# Altium footprint library SMDLibrary.PcbLib: 309 footprints (part 10 of 20)
Each footprint in its own frame and in the unit in brackets; x right, y up, seen from the top. Pads: shape width x height; smd on the part's side, far side on the other; paste and mask are expansions set on the pad; w line width, h text height; cw(c..) or ccw(c..) is an arc to the next point about the centre after c.
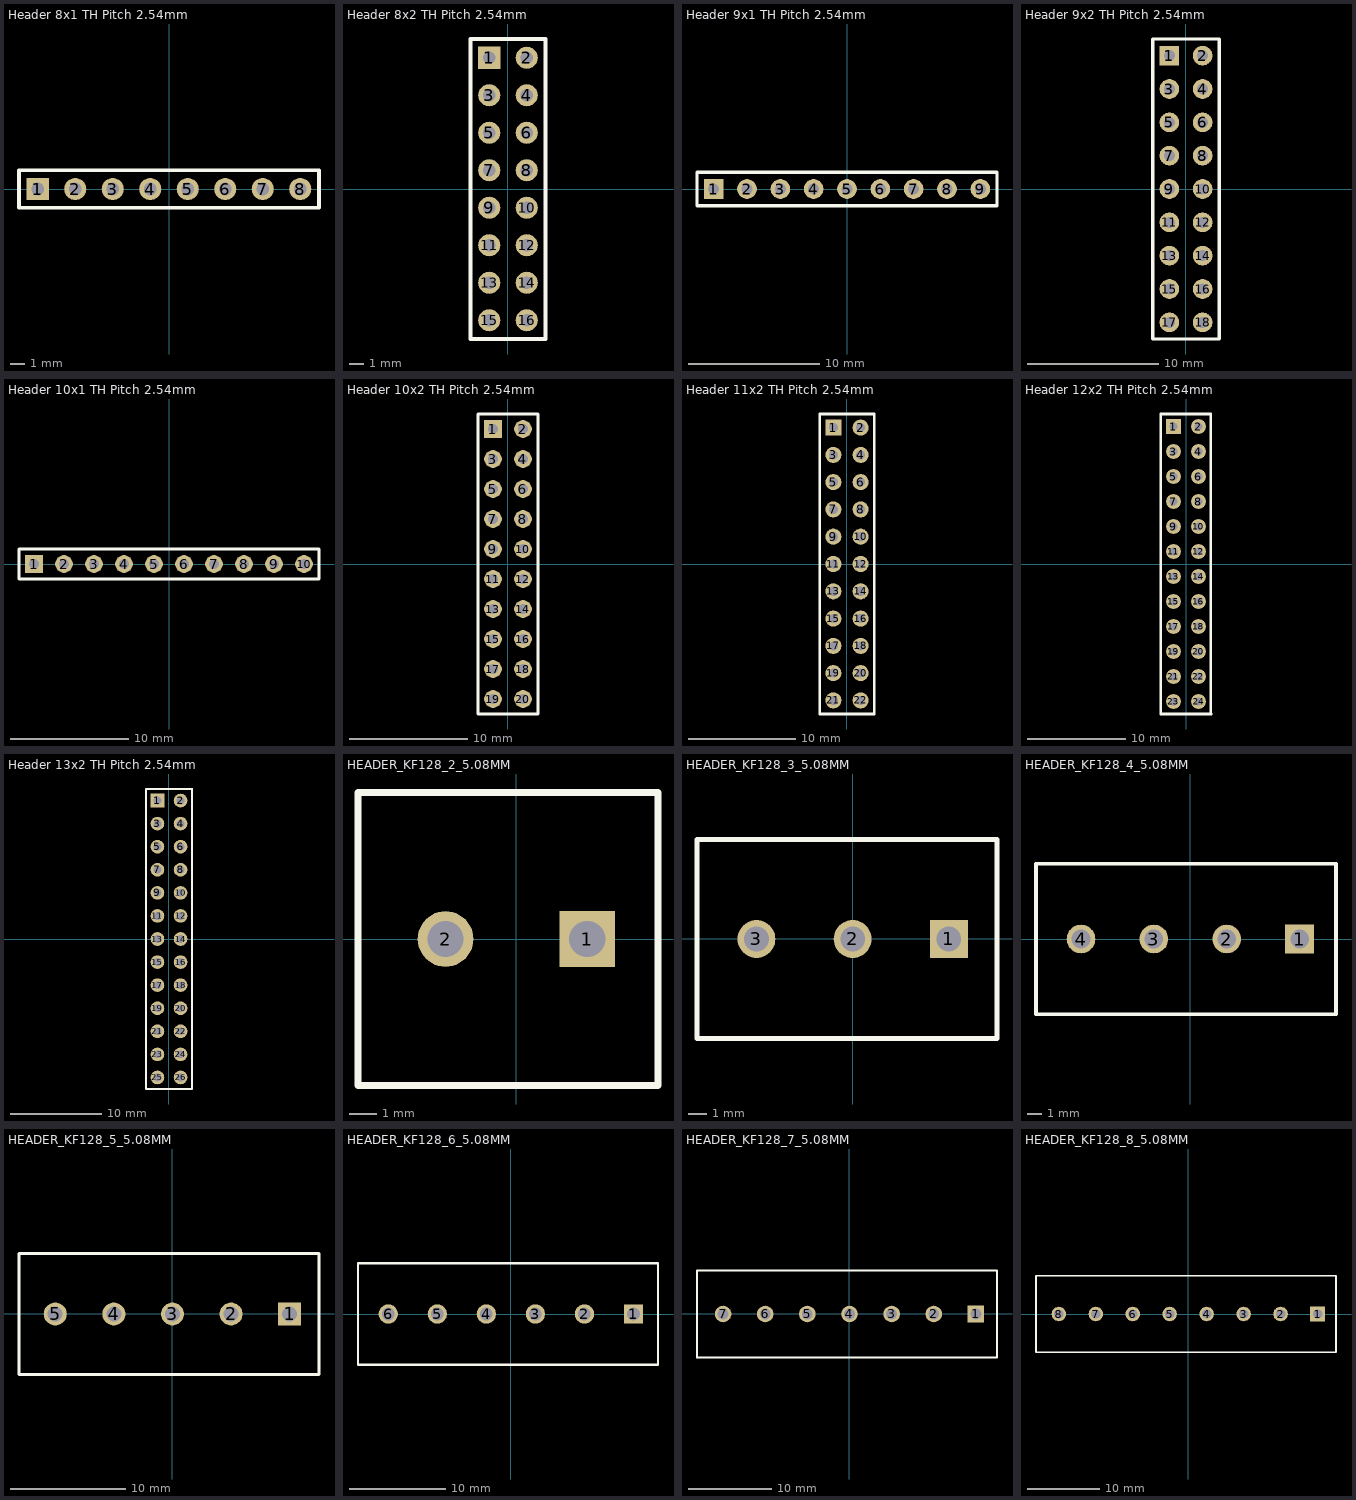
[diagram p9: the footprints below, top view; thin cyan lines are the x and y axes]

## Header 8x1 TH Pitch 2.54mm [mm]
pads (8):
  rect 1.5x1.5 hole 0.85: 1(-8.89,0)
  round 1.5 hole 0.85: 2(-6.35,0) 3(-3.81,0) 4(-1.27,0) 5(1.27,0) 6(3.81,0) 7(6.35,0) 8(8.89,0)
Top Overlay:
  lines w0.254: -10.16,-1.27 -10.16,1.27 10.16,1.27 10.16,-1.27 -10.16,-1.27
3D body "zl201-1_p2-54_l2-54_w2-54_h8-89.stp": height 8.89, standoff -3.05, extent 7.62,-1.27 10.16,1.27
3D body "zl201-1_p2-54_l2-54_w2-54_h8-89.stp": height 8.89, standoff -3.05, extent 5.08,-1.27 7.62,1.27
3D body "zl201-1_p2-54_l2-54_w2-54_h8-89.stp": height 8.89, standoff -3.05, extent 2.54,-1.27 5.08,1.27
3D body "zl201-1_p2-54_l2-54_w2-54_h8-89.stp": height 8.89, standoff -3.05, extent 0,-1.27 2.54,1.27
3D body "zl201-1_p2-54_l2-54_w2-54_h8-89.stp": height 8.89, standoff -3.05, extent -2.54,-1.27 0,1.27
3D body "zl201-1_p2-54_l2-54_w2-54_h8-89.stp": height 8.89, standoff -3.05, extent -5.08,-1.27 -2.54,1.27
3D body "zl201-1_p2-54_l2-54_w2-54_h8-89.stp": height 8.89, standoff -3.05, extent -7.62,-1.27 -5.08,1.27
3D body "zl201-1_p2-54_l2-54_w2-54_h8-89.stp": height 8.89, standoff -3.05, extent -10.16,-1.27 -7.62,1.27

## Header 8x2 TH Pitch 2.54mm [mm]
pads (16):
  rect 1.5x1.5 hole 0.85: 1(-1.27,8.89)
  round 1.5 hole 0.85: 2(1.27,8.89) 3(-1.27,6.35) 4(1.27,6.35) 5(-1.27,3.81) 6(1.27,3.81) 7(-1.27,1.27) 8(1.27,1.27) 9(-1.27,-1.27) 10(1.27,-1.27) 11(-1.27,-3.81) 12(1.27,-3.81) 13(-1.27,-6.35) 14(1.27,-6.35) 15(-1.27,-8.89) 16(1.27,-8.89)
Top Overlay:
  lines w0.254: -2.54,-10.16 -2.54,-10.159 ; -2.54,-10.16 -2.54,10.16 2.54,10.16 2.54,-10.159 -2.54,-10.159
3D body "zl201-1_p2-54_l2-54_w2-54_h8-89.stp": height 8.89, standoff -3.05, extent -2.54,7.62 0,10.16
3D body "zl201-1_p2-54_l2-54_w2-54_h8-89.stp": height 8.89, standoff -3.05, extent 0,7.62 2.54,10.16
3D body "zl201-1_p2-54_l2-54_w2-54_h8-89.stp": height 8.89, standoff -3.05, extent -2.54,5.08 0,7.62
3D body "zl201-1_p2-54_l2-54_w2-54_h8-89.stp": height 8.89, standoff -3.05, extent 0,5.08 2.54,7.62
3D body "zl201-1_p2-54_l2-54_w2-54_h8-89.stp": height 8.89, standoff -3.05, extent -2.54,2.541 0,5.081
3D body "zl201-1_p2-54_l2-54_w2-54_h8-89.stp": height 8.89, standoff -3.05, extent -2.54,0 0,2.54
3D body "zl201-1_p2-54_l2-54_w2-54_h8-89.stp": height 8.89, standoff -3.05, extent -2.54,-2.54 0,0
3D body "zl201-1_p2-54_l2-54_w2-54_h8-89.stp": height 8.89, standoff -3.05, extent -2.54,-5.08 0,-2.54
3D body "zl201-1_p2-54_l2-54_w2-54_h8-89.stp": height 8.89, standoff -3.05, extent -2.54,-7.62 0,-5.08
3D body "zl201-1_p2-54_l2-54_w2-54_h8-89.stp": height 8.89, standoff -3.05, extent -2.54,-10.16 0,-7.62
3D body "zl201-1_p2-54_l2-54_w2-54_h8-89.stp": height 8.89, standoff -3.05, extent 0,2.54 2.54,5.08
3D body "zl201-1_p2-54_l2-54_w2-54_h8-89.stp": height 8.89, standoff -3.05, extent 0,0 2.54,2.54
3D body "zl201-1_p2-54_l2-54_w2-54_h8-89.stp": height 8.89, standoff -3.05, extent 0,-2.54 2.54,0
3D body "zl201-1_p2-54_l2-54_w2-54_h8-89.stp": height 8.89, standoff -3.05, extent 0,-5.08 2.54,-2.54
3D body "zl201-1_p2-54_l2-54_w2-54_h8-89.stp": height 8.89, standoff -3.05, extent 0,-10.16 2.54,-7.62
3D body "zl201-1_p2-54_l2-54_w2-54_h8-89.stp": height 8.89, standoff -3.05, extent 0,-7.62 2.54,-5.08

## Header 9x1 TH Pitch 2.54mm [mm]
pads (9):
  rect 1.5x1.5 hole 0.85: 1(-10.16,0)
  round 1.5 hole 0.85: 2(-7.62,0) 3(-5.08,0) 4(-2.54,0) 5(0,0) 6(2.54,0) 7(5.08,0) 8(7.62,0) 9(10.16,0)
Top Overlay:
  lines w0.254: -11.43,-1.27 11.43,-1.27 11.43,1.27 -11.43,1.27 -11.43,-1.27
3D body "zl201-1_p2-54_l2-54_w2-54_h8-89.stp": height 8.89, standoff -3.05, extent 8.89,-1.27 11.43,1.27
3D body "zl201-1_p2-54_l2-54_w2-54_h8-89.stp": height 8.89, standoff -3.05, extent 6.35,-1.27 8.89,1.27
3D body "zl201-1_p2-54_l2-54_w2-54_h8-89.stp": height 8.89, standoff -3.05, extent 3.81,-1.27 6.35,1.27
3D body "zl201-1_p2-54_l2-54_w2-54_h8-89.stp": height 8.89, standoff -3.05, extent 1.27,-1.27 3.81,1.27
3D body "zl201-1_p2-54_l2-54_w2-54_h8-89.stp": height 8.89, standoff -3.05, extent -1.27,-1.27 1.27,1.27
3D body "zl201-1_p2-54_l2-54_w2-54_h8-89.stp": height 8.89, standoff -3.05, extent -3.81,-1.27 -1.27,1.27
3D body "zl201-1_p2-54_l2-54_w2-54_h8-89.stp": height 8.89, standoff -3.05, extent -6.35,-1.27 -3.81,1.27
3D body "zl201-1_p2-54_l2-54_w2-54_h8-89.stp": height 8.89, standoff -3.05, extent -8.89,-1.27 -6.35,1.27
3D body "zl201-1_p2-54_l2-54_w2-54_h8-89.stp": height 8.89, standoff -3.05, extent -11.43,-1.27 -8.89,1.27

## Header 9x2 TH Pitch 2.54mm [mm]
pads (18):
  rect 1.5x1.5 hole 0.85: 1(-1.27,10.16)
  round 1.5 hole 0.85: 2(1.27,10.16) 3(-1.27,7.62) 4(1.27,7.62) 5(-1.27,5.08) 6(1.27,5.08) 7(-1.27,2.54) 8(1.27,2.54) 9(-1.27,0) 10(1.27,0) 11(-1.27,-2.54) 12(1.27,-2.54) 13(-1.27,-5.08) 14(1.27,-5.08) 15(-1.27,-7.62) 16(1.27,-7.62) 17(-1.27,-10.16) 18(1.27,-10.16)
Top Overlay:
  lines w0.254: -2.54,-11.429 2.54,-11.429 2.54,-11.429 2.54,11.43 -2.54,11.43 -2.54,-11.43 ; -2.54,-11.43 -2.54,-11.429
3D body "zl201-1_p2-54_l2-54_w2-54_h8-89.stp": height 8.89, standoff -3.05, extent 0,-11.429 2.54,-8.889
3D body "zl201-1_p2-54_l2-54_w2-54_h8-89.stp": height 8.89, standoff -3.05, extent 0,-6.35 2.54,-3.81
3D body "zl201-1_p2-54_l2-54_w2-54_h8-89.stp": height 8.89, standoff -3.05, extent 0,-8.89 2.54,-6.35
3D body "zl201-1_p2-54_l2-54_w2-54_h8-89.stp": height 8.89, standoff -3.05, extent 0,-3.81 2.54,-1.27
3D body "zl201-1_p2-54_l2-54_w2-54_h8-89.stp": height 8.89, standoff -3.05, extent 0,-1.27 2.54,1.27
3D body "zl201-1_p2-54_l2-54_w2-54_h8-89.stp": height 8.89, standoff -3.05, extent 0,1.27 2.54,3.81
3D body "zl201-1_p2-54_l2-54_w2-54_h8-89.stp": height 8.89, standoff -3.05, extent 0,3.81 2.54,6.35
3D body "zl201-1_p2-54_l2-54_w2-54_h8-89.stp": height 8.89, standoff -3.05, extent -2.54,-11.43 0,-8.89
3D body "zl201-1_p2-54_l2-54_w2-54_h8-89.stp": height 8.89, standoff -3.05, extent -2.54,-8.89 0,-6.35
3D body "zl201-1_p2-54_l2-54_w2-54_h8-89.stp": height 8.89, standoff -3.05, extent -2.54,-6.35 0,-3.81
3D body "zl201-1_p2-54_l2-54_w2-54_h8-89.stp": height 8.89, standoff -3.05, extent -2.54,-3.81 0,-1.27
3D body "zl201-1_p2-54_l2-54_w2-54_h8-89.stp": height 8.89, standoff -3.05, extent -2.54,-1.27 0,1.27
3D body "zl201-1_p2-54_l2-54_w2-54_h8-89.stp": height 8.89, standoff -3.05, extent -2.54,1.27 0,3.81
3D body "zl201-1_p2-54_l2-54_w2-54_h8-89.stp": height 8.89, standoff -3.05, extent -2.54,3.811 0,6.351
3D body "zl201-1_p2-54_l2-54_w2-54_h8-89.stp": height 8.89, standoff -3.05, extent 0,6.35 2.54,8.89
3D body "zl201-1_p2-54_l2-54_w2-54_h8-89.stp": height 8.89, standoff -3.05, extent -2.54,6.35 0,8.89
3D body "zl201-1_p2-54_l2-54_w2-54_h8-89.stp": height 8.89, standoff -3.05, extent 0,8.89 2.54,11.43
3D body "zl201-1_p2-54_l2-54_w2-54_h8-89.stp": height 8.89, standoff -3.05, extent -2.54,8.89 0,11.43

## Header 10x1 TH Pitch 2.54mm [mm]
pads (10):
  rect 1.5x1.5 hole 0.85: 1(-11.43,0)
  round 1.5 hole 0.85: 2(-8.89,0) 3(-6.35,0) 4(-3.81,0) 5(-1.27,0) 6(1.27,0) 7(3.81,0) 8(6.35,0) 9(8.89,0) 10(11.43,0)
Top Overlay:
  lines w0.254: -12.7,-1.27 12.7,-1.27 12.7,1.27 -12.7,1.27 -12.7,-1.27
3D body "zl201-1_p2-54_l2-54_w2-54_h8-89.stp": height 8.89, standoff -3.05, extent -12.7,-1.27 -10.16,1.27
3D body "zl201-1_p2-54_l2-54_w2-54_h8-89.stp": height 8.89, standoff -3.05, extent -10.16,-1.27 -7.62,1.27
3D body "zl201-1_p2-54_l2-54_w2-54_h8-89.stp": height 8.89, standoff -3.05, extent -7.62,-1.27 -5.08,1.27
3D body "zl201-1_p2-54_l2-54_w2-54_h8-89.stp": height 8.89, standoff -3.05, extent -5.08,-1.27 -2.54,1.27
3D body "zl201-1_p2-54_l2-54_w2-54_h8-89.stp": height 8.89, standoff -3.05, extent -2.54,-1.27 0,1.27
3D body "zl201-1_p2-54_l2-54_w2-54_h8-89.stp": height 8.89, standoff -3.05, extent 0,-1.27 2.54,1.27
3D body "zl201-1_p2-54_l2-54_w2-54_h8-89.stp": height 8.89, standoff -3.05, extent 2.54,-1.27 5.08,1.27
3D body "zl201-1_p2-54_l2-54_w2-54_h8-89.stp": height 8.89, standoff -3.05, extent 5.08,-1.27 7.62,1.27
3D body "zl201-1_p2-54_l2-54_w2-54_h8-89.stp": height 8.89, standoff -3.05, extent 7.62,-1.27 10.16,1.27
3D body "zl201-1_p2-54_l2-54_w2-54_h8-89.stp": height 8.89, standoff -3.05, extent 10.16,-1.27 12.7,1.27

## Header 10x2 TH Pitch 2.54mm [mm]
pads (20):
  rect 1.5x1.5 hole 0.85: 1(-1.27,11.43)
  round 1.5 hole 0.85: 2(1.27,11.43) 3(-1.27,8.89) 4(1.27,8.89) 5(-1.27,6.35) 6(1.27,6.35) 7(-1.27,3.81) 8(1.27,3.81) 9(-1.27,1.27) 10(1.27,1.27) 11(-1.27,-1.27) 12(1.27,-1.27) 13(-1.27,-3.81) 14(1.27,-3.81) 15(-1.27,-6.35) 16(1.27,-6.35) 17(-1.27,-8.89) 18(1.27,-8.89) 19(-1.27,-11.43) 20(1.27,-11.43)
Top Overlay:
  lines w0.254: 2.54,12.7 2.54,12.7 ; 2.54,12.7 -2.54,12.7 -2.54,-12.7 2.54,-12.7 2.54,12.7
3D body "zl201-1_p2-54_l2-54_w2-54_h8-89.stp": height 8.89, standoff -3.05, extent 0,-12.7 2.54,-10.16
3D body "zl201-1_p2-54_l2-54_w2-54_h8-89.stp": height 8.89, standoff -3.05, extent -2.54,-12.7 0,-10.16
3D body "zl201-1_p2-54_l2-54_w2-54_h8-89.stp": height 8.89, standoff -3.05, extent 0,-10.16 2.54,-7.62
3D body "zl201-1_p2-54_l2-54_w2-54_h8-89.stp": height 8.89, standoff -3.05, extent -2.54,-10.16 0,-7.62
3D body "zl201-1_p2-54_l2-54_w2-54_h8-89.stp": height 8.89, standoff -3.05, extent -2.54,10.16 0,12.7
3D body "zl201-1_p2-54_l2-54_w2-54_h8-89.stp": height 8.89, standoff -3.05, extent 0,10.16 2.54,12.7
3D body "zl201-1_p2-54_l2-54_w2-54_h8-89.stp": height 8.89, standoff -3.05, extent -2.54,7.62 0,10.16
3D body "zl201-1_p2-54_l2-54_w2-54_h8-89.stp": height 8.89, standoff -3.05, extent 0,7.62 2.54,10.16
3D body "zl201-1_p2-54_l2-54_w2-54_h8-89.stp": height 8.89, standoff -3.05, extent -2.54,5.081 0,7.621
3D body "zl201-1_p2-54_l2-54_w2-54_h8-89.stp": height 8.89, standoff -3.05, extent -2.54,2.54 0,5.08
3D body "zl201-1_p2-54_l2-54_w2-54_h8-89.stp": height 8.89, standoff -3.05, extent -2.54,0 0,2.54
3D body "zl201-1_p2-54_l2-54_w2-54_h8-89.stp": height 8.89, standoff -3.05, extent -2.54,-2.54 0,0
3D body "zl201-1_p2-54_l2-54_w2-54_h8-89.stp": height 8.89, standoff -3.05, extent -2.54,-5.08 0,-2.54
3D body "zl201-1_p2-54_l2-54_w2-54_h8-89.stp": height 8.89, standoff -3.05, extent -2.54,-7.62 0,-5.08
3D body "zl201-1_p2-54_l2-54_w2-54_h8-89.stp": height 8.89, standoff -3.05, extent 0,5.08 2.54,7.62
3D body "zl201-1_p2-54_l2-54_w2-54_h8-89.stp": height 8.89, standoff -3.05, extent 0,2.54 2.54,5.08
3D body "zl201-1_p2-54_l2-54_w2-54_h8-89.stp": height 8.89, standoff -3.05, extent 0,0 2.54,2.54
3D body "zl201-1_p2-54_l2-54_w2-54_h8-89.stp": height 8.89, standoff -3.05, extent 0,-2.54 2.54,0
3D body "zl201-1_p2-54_l2-54_w2-54_h8-89.stp": height 8.89, standoff -3.05, extent 0,-7.62 2.54,-5.08
3D body "zl201-1_p2-54_l2-54_w2-54_h8-89.stp": height 8.89, standoff -3.05, extent 0,-5.08 2.54,-2.54

## Header 11x2 TH Pitch 2.54mm [mm]
pads (22):
  rect 1.5x1.5 hole 0.85: 1(-1.27,12.7)
  round 1.5 hole 0.85: 2(1.27,12.7) 3(-1.27,10.16) 4(1.27,10.16) 5(-1.27,7.62) 6(1.27,7.62) 7(-1.27,5.08) 8(1.27,5.08) 9(-1.27,2.54) 10(1.27,2.54) 11(-1.27,0) 12(1.27,0) 13(-1.27,-2.54) 14(1.27,-2.54) 15(-1.27,-5.08) 16(1.27,-5.08) 17(-1.27,-7.62) 18(1.27,-7.62) 19(-1.27,-10.16) 20(1.27,-10.16) 21(-1.27,-12.7) 22(1.27,-12.7)
Top Overlay:
  lines w0.254: 2.54,13.97 -2.54,13.97 -2.54,-13.97 2.54,-13.97 2.54,13.97 ; 2.54,13.97 2.54,13.97
3D body "zl201-1_p2-54_l2-54_w2-54_h8-89.stp": height 8.89, standoff -3.05, extent 0,-13.97 2.54,-11.43
3D body "zl201-1_p2-54_l2-54_w2-54_h8-89.stp": height 8.89, standoff -3.05, extent -2.54,-13.97 0,-11.43
3D body "zl201-1_p2-54_l2-54_w2-54_h8-89.stp": height 8.89, standoff -3.05, extent 0,-11.43 2.54,-8.89
3D body "zl201-1_p2-54_l2-54_w2-54_h8-89.stp": height 8.89, standoff -3.05, extent -2.54,-11.43 0,-8.89
3D body "zl201-1_p2-54_l2-54_w2-54_h8-89.stp": height 8.89, standoff -3.05, extent 0,-8.89 2.54,-6.35
3D body "zl201-1_p2-54_l2-54_w2-54_h8-89.stp": height 8.89, standoff -3.05, extent -2.54,-8.89 0,-6.35
3D body "zl201-1_p2-54_l2-54_w2-54_h8-89.stp": height 8.89, standoff -3.05, extent -2.54,11.43 0,13.97
3D body "zl201-1_p2-54_l2-54_w2-54_h8-89.stp": height 8.89, standoff -3.05, extent 0,11.43 2.54,13.97
3D body "zl201-1_p2-54_l2-54_w2-54_h8-89.stp": height 8.89, standoff -3.05, extent -2.54,8.89 0,11.43
3D body "zl201-1_p2-54_l2-54_w2-54_h8-89.stp": height 8.89, standoff -3.05, extent 0,8.89 2.54,11.43
3D body "zl201-1_p2-54_l2-54_w2-54_h8-89.stp": height 8.89, standoff -3.05, extent -2.54,6.351 0,8.891
3D body "zl201-1_p2-54_l2-54_w2-54_h8-89.stp": height 8.89, standoff -3.05, extent -2.54,3.81 0,6.35
3D body "zl201-1_p2-54_l2-54_w2-54_h8-89.stp": height 8.89, standoff -3.05, extent -2.54,1.27 0,3.81
3D body "zl201-1_p2-54_l2-54_w2-54_h8-89.stp": height 8.89, standoff -3.05, extent -2.54,-1.27 0,1.27
3D body "zl201-1_p2-54_l2-54_w2-54_h8-89.stp": height 8.89, standoff -3.05, extent -2.54,-3.81 0,-1.27
3D body "zl201-1_p2-54_l2-54_w2-54_h8-89.stp": height 8.89, standoff -3.05, extent -2.54,-6.35 0,-3.81
3D body "zl201-1_p2-54_l2-54_w2-54_h8-89.stp": height 8.89, standoff -3.05, extent 0,6.35 2.54,8.89
3D body "zl201-1_p2-54_l2-54_w2-54_h8-89.stp": height 8.89, standoff -3.05, extent 0,3.81 2.54,6.35
3D body "zl201-1_p2-54_l2-54_w2-54_h8-89.stp": height 8.89, standoff -3.05, extent 0,1.27 2.54,3.81
3D body "zl201-1_p2-54_l2-54_w2-54_h8-89.stp": height 8.89, standoff -3.05, extent 0,-1.27 2.54,1.27
3D body "zl201-1_p2-54_l2-54_w2-54_h8-89.stp": height 8.89, standoff -3.05, extent 0,-6.35 2.54,-3.81
3D body "zl201-1_p2-54_l2-54_w2-54_h8-89.stp": height 8.89, standoff -3.05, extent 0,-3.81 2.54,-1.27

## Header 12x2 TH Pitch 2.54mm [mm]
pads (24):
  rect 1.5x1.5 hole 0.85: 1(-1.27,13.97)
  round 1.5 hole 0.85: 2(1.27,13.97) 3(-1.27,11.43) 4(1.27,11.43) 5(-1.27,8.89) 6(1.27,8.89) 7(-1.27,6.35) 8(1.27,6.35) 9(-1.27,3.81) 10(1.27,3.81) 11(-1.27,1.27) 12(1.27,1.27) 13(-1.27,-1.27) 14(1.27,-1.27) 15(-1.27,-3.81) 16(1.27,-3.81) 17(-1.27,-6.35) 18(1.27,-6.35) 19(-1.27,-8.89) 20(1.27,-8.89) 21(-1.27,-11.43) 22(1.27,-11.43) 23(-1.27,-13.97) 24(1.27,-13.97)
Top Overlay:
  lines w0.254: -2.54,15.24 2.54,15.24 2.54,-15.239 2.54,-15.24 -2.54,-15.24 -2.54,15.24 ; -2.54,15.24 -2.54,15.24
3D body "zl201-1_p2-54_l2-54_w2-54_h8-89.stp": height 8.89, standoff -3.05, extent 0,-2.54 2.54,0
3D body "zl201-1_p2-54_l2-54_w2-54_h8-89.stp": height 8.89, standoff -3.05, extent 0,-5.08 2.54,-2.54
3D body "zl201-1_p2-54_l2-54_w2-54_h8-89.stp": height 8.89, standoff -3.05, extent 0,0 2.54,2.54
3D body "zl201-1_p2-54_l2-54_w2-54_h8-89.stp": height 8.89, standoff -3.05, extent 0,2.54 2.54,5.08
3D body "zl201-1_p2-54_l2-54_w2-54_h8-89.stp": height 8.89, standoff -3.05, extent 0,5.08 2.54,7.62
3D body "zl201-1_p2-54_l2-54_w2-54_h8-89.stp": height 8.89, standoff -3.05, extent 0,7.62 2.54,10.16
3D body "zl201-1_p2-54_l2-54_w2-54_h8-89.stp": height 8.89, standoff -3.05, extent -2.54,-5.08 0,-2.54
3D body "zl201-1_p2-54_l2-54_w2-54_h8-89.stp": height 8.89, standoff -3.05, extent -2.54,-2.54 0,0
3D body "zl201-1_p2-54_l2-54_w2-54_h8-89.stp": height 8.89, standoff -3.05, extent -2.54,0 0,2.54
3D body "zl201-1_p2-54_l2-54_w2-54_h8-89.stp": height 8.89, standoff -3.05, extent -2.54,2.54 0,5.08
3D body "zl201-1_p2-54_l2-54_w2-54_h8-89.stp": height 8.89, standoff -3.05, extent -2.54,5.08 0,7.62
3D body "zl201-1_p2-54_l2-54_w2-54_h8-89.stp": height 8.89, standoff -3.05, extent -2.54,7.62 0,10.16
3D body "zl201-1_p2-54_l2-54_w2-54_h8-89.stp": height 8.89, standoff -3.05, extent 0,10.16 2.54,12.7
3D body "zl201-1_p2-54_l2-54_w2-54_h8-89.stp": height 8.89, standoff -3.05, extent -2.54,10.16 0,12.7
3D body "zl201-1_p2-54_l2-54_w2-54_h8-89.stp": height 8.89, standoff -3.05, extent 0,12.7 2.54,15.24
3D body "zl201-1_p2-54_l2-54_w2-54_h8-89.stp": height 8.89, standoff -3.05, extent -2.54,12.7 0,15.24
3D body "zl201-1_p2-54_l2-54_w2-54_h8-89.stp": height 8.89, standoff -3.05, extent -2.54,-7.62 0,-5.08
3D body "zl201-1_p2-54_l2-54_w2-54_h8-89.stp": height 8.89, standoff -3.05, extent 0,-7.62 2.54,-5.08
3D body "zl201-1_p2-54_l2-54_w2-54_h8-89.stp": height 8.89, standoff -3.05, extent -2.54,-10.16 0,-7.62
3D body "zl201-1_p2-54_l2-54_w2-54_h8-89.stp": height 8.89, standoff -3.05, extent 0,-10.16 2.54,-7.62
3D body "zl201-1_p2-54_l2-54_w2-54_h8-89.stp": height 8.89, standoff -3.05, extent -2.54,-12.7 0,-10.16
3D body "zl201-1_p2-54_l2-54_w2-54_h8-89.stp": height 8.89, standoff -3.05, extent 0,-12.7 2.54,-10.16
3D body "zl201-1_p2-54_l2-54_w2-54_h8-89.stp": height 8.89, standoff -3.05, extent 0,-15.24 2.54,-12.7
3D body "zl201-1_p2-54_l2-54_w2-54_h8-89.stp": height 8.89, standoff -3.05, extent -2.54,-15.24 0,-12.7

## Header 13x2 TH Pitch 2.54mm [mm]
pads (26):
  rect 1.5x1.5 hole 0.85: 1(-1.27,15.24)
  round 1.5 hole 0.85: 2(1.27,15.24) 3(-1.27,12.7) 4(1.27,12.7) 5(-1.27,10.16) 6(1.27,10.16) 7(-1.27,7.62) 8(1.27,7.62) 9(-1.27,5.08) 10(1.27,5.08) 11(-1.27,2.54) 12(1.27,2.54) 13(-1.27,0) 14(1.27,0) 15(-1.27,-2.54) 16(1.27,-2.54) 17(-1.27,-5.08) 18(1.27,-5.08) 19(-1.27,-7.62) 20(1.27,-7.62) 21(-1.27,-10.16) 22(1.27,-10.16) 23(-1.27,-12.7) 24(1.27,-12.7) 25(-1.27,-15.24) 26(1.27,-15.24)
Top Overlay:
  lines w0.254: 2.54,16.51 2.54,16.51 ; 2.54,16.51 2.54,-16.509 -2.54,-16.509 -2.54,16.51 2.54,16.51
3D body "zl201-1_p2-54_l2-54_w2-54_h8-89.stp": height 8.89, standoff -3.05, extent -2.54,-16.509 0,-13.969
3D body "zl201-1_p2-54_l2-54_w2-54_h8-89.stp": height 8.89, standoff -3.05, extent 0,-16.509 2.54,-13.969
3D body "zl201-1_p2-54_l2-54_w2-54_h8-89.stp": height 8.89, standoff -3.05, extent -2.54,-13.969 0,-11.429
3D body "zl201-1_p2-54_l2-54_w2-54_h8-89.stp": height 8.89, standoff -3.05, extent 0,-13.969 2.54,-11.429
3D body "zl201-1_p2-54_l2-54_w2-54_h8-89.stp": height 8.89, standoff -3.05, extent 0,-11.43 2.54,-8.89
3D body "zl201-1_p2-54_l2-54_w2-54_h8-89.stp": height 8.89, standoff -3.05, extent -2.54,-11.43 0,-8.89
3D body "zl201-1_p2-54_l2-54_w2-54_h8-89.stp": height 8.89, standoff -3.05, extent 0,-8.89 2.54,-6.35
3D body "zl201-1_p2-54_l2-54_w2-54_h8-89.stp": height 8.89, standoff -3.05, extent -2.54,-8.89 0,-6.35
3D body "zl201-1_p2-54_l2-54_w2-54_h8-89.stp": height 8.89, standoff -3.05, extent 0,-6.35 2.54,-3.81
3D body "zl201-1_p2-54_l2-54_w2-54_h8-89.stp": height 8.89, standoff -3.05, extent -2.54,-6.35 0,-3.81
3D body "zl201-1_p2-54_l2-54_w2-54_h8-89.stp": height 8.89, standoff -3.05, extent -2.54,13.97 0,16.51
3D body "zl201-1_p2-54_l2-54_w2-54_h8-89.stp": height 8.89, standoff -3.05, extent 0,13.97 2.54,16.51
3D body "zl201-1_p2-54_l2-54_w2-54_h8-89.stp": height 8.89, standoff -3.05, extent -2.54,11.43 0,13.97
3D body "zl201-1_p2-54_l2-54_w2-54_h8-89.stp": height 8.89, standoff -3.05, extent 0,11.43 2.54,13.97
3D body "zl201-1_p2-54_l2-54_w2-54_h8-89.stp": height 8.89, standoff -3.05, extent -2.54,8.89 0,11.43
3D body "zl201-1_p2-54_l2-54_w2-54_h8-89.stp": height 8.89, standoff -3.05, extent -2.54,6.35 0,8.89
3D body "zl201-1_p2-54_l2-54_w2-54_h8-89.stp": height 8.89, standoff -3.05, extent -2.54,3.81 0,6.35
3D body "zl201-1_p2-54_l2-54_w2-54_h8-89.stp": height 8.89, standoff -3.05, extent -2.54,1.27 0,3.81
3D body "zl201-1_p2-54_l2-54_w2-54_h8-89.stp": height 8.89, standoff -3.05, extent -2.54,-1.27 0,1.27
3D body "zl201-1_p2-54_l2-54_w2-54_h8-89.stp": height 8.89, standoff -3.05, extent -2.54,-3.81 0,-1.27
3D body "zl201-1_p2-54_l2-54_w2-54_h8-89.stp": height 8.89, standoff -3.05, extent 0,8.89 2.54,11.43
3D body "zl201-1_p2-54_l2-54_w2-54_h8-89.stp": height 8.89, standoff -3.05, extent 0,6.35 2.54,8.89
3D body "zl201-1_p2-54_l2-54_w2-54_h8-89.stp": height 8.89, standoff -3.05, extent 0,3.81 2.54,6.35
3D body "zl201-1_p2-54_l2-54_w2-54_h8-89.stp": height 8.89, standoff -3.05, extent 0,1.27 2.54,3.81
3D body "zl201-1_p2-54_l2-54_w2-54_h8-89.stp": height 8.89, standoff -3.05, extent 0,-3.81 2.54,-1.27
3D body "zl201-1_p2-54_l2-54_w2-54_h8-89.stp": height 8.89, standoff -3.05, extent 0,-1.27 2.54,1.27

## HEADER_KF128_2_5.08MM [mm]
pads (2):
  rect 2x2 hole 1.3: 1(2.54,0)
  round 2 hole 1.3: 2(-2.54,0)
Top Overlay:
  lines w0.254: -5.68,-5.25 5.08,-5.25 5.08,5.25 -5.68,5.25 -5.68,-5.25
3D body "User Library-KF128.STEP": height 14.3, standoff -5, extent -0.6,-5.25 5.08,5.25
3D body "User Library-KF128.STEP": height 14.3, standoff -5, extent -5.68,-5.25 0,5.25

## HEADER_KF128_3_5.08MM [mm]
pads (3):
  rect 2x2 hole 1.3: 1(5.08,0)
  round 2 hole 1.3: 2(0,0) 3(-5.08,0)
Top Overlay:
  lines w0.254: -8.22,-5.25 -8.22,-5.25 ; -8.22,-5.25 7.62,-5.25 7.62,5.25 -8.22,5.25 -8.22,-5.25
3D body "User Library-KF128.STEP": height 14.3, standoff -5, extent -3.14,-5.25 2.54,5.25
3D body "User Library-KF128.STEP": height 14.3, standoff -5, extent 1.94,-5.25 7.62,5.25
3D body "User Library-KF128.STEP": height 14.3, standoff -5, extent -8.22,-5.25 -2.54,5.25

## HEADER_KF128_4_5.08MM [mm]
pads (4):
  rect 2x2 hole 1.3: 1(7.62,0)
  round 2 hole 1.3: 2(2.54,0) 3(-2.54,0) 4(-7.62,0)
Top Overlay:
  lines w0.254: -10.76,5.25 10.16,5.25 10.16,-5.25 -10.76,-5.25 -10.76,5.25 ; -10.76,5.25 -10.76,5.25
3D body "User Library-KF128.STEP": height 14.3, standoff -5, extent -0.6,-5.25 5.08,5.25
3D body "User Library-KF128.STEP": height 14.3, standoff -5, extent 4.48,-5.25 10.16,5.25
3D body "User Library-KF128.STEP": height 14.3, standoff -5, extent -5.68,-5.25 0,5.25
3D body "User Library-KF128.STEP": height 14.3, standoff -5, extent -10.76,-5.25 -5.08,5.25

## HEADER_KF128_5_5.08MM [mm]
pads (5):
  rect 2x2 hole 1.3: 1(10.16,0)
  round 2 hole 1.3: 2(5.08,0) 3(0,0) 4(-5.08,0) 5(-10.16,0)
Top Overlay:
  lines w0.254: -13.3,-5.25 -13.3,-5.25 ; -13.3,-5.25 12.7,-5.25 12.7,5.25 ; -13.3,-5.25 -13.3,5.25 12.7,5.25 ; 12.7,5.25 12.7,5.25
3D body "User Library-KF128.STEP": height 14.3, standoff -5, extent 1.94,-5.25 7.62,5.25
3D body "User Library-KF128.STEP": height 14.3, standoff -5, extent 7.02,-5.25 12.7,5.25
3D body "User Library-KF128.STEP": height 14.3, standoff -5, extent -3.14,-5.25 2.54,5.25
3D body "User Library-KF128.STEP": height 14.3, standoff -5, extent -8.22,-5.25 -2.54,5.25
3D body "User Library-KF128.STEP": height 14.3, standoff -5, extent -13.3,-5.25 -7.62,5.25

## HEADER_KF128_6_5.08MM [mm]
pads (6):
  rect 2x2 hole 1.3: 1(12.7,0)
  round 2 hole 1.3: 2(7.62,0) 3(2.54,0) 4(-2.54,0) 5(-7.62,0) 6(-12.7,0)
Top Overlay:
  lines w0.254: -15.84,-5.25 15.24,-5.25 15.24,5.25 -15.84,5.25 -15.84,-5.25
3D body "User Library-KF128.STEP": height 14.3, standoff -5, extent 4.48,-5.25 10.16,5.25
3D body "User Library-KF128.STEP": height 14.3, standoff -5, extent 9.56,-5.25 15.24,5.25
3D body "User Library-KF128.STEP": height 14.3, standoff -5, extent -0.6,-5.25 5.08,5.25
3D body "User Library-KF128.STEP": height 14.3, standoff -5, extent -5.68,-5.25 0,5.25
3D body "User Library-KF128.STEP": height 14.3, standoff -5, extent -10.76,-5.25 -5.08,5.25
3D body "User Library-KF128.STEP": height 14.3, standoff -5, extent -15.84,-5.25 -10.16,5.25

## HEADER_KF128_7_5.08MM [mm]
pads (7):
  rect 2x2 hole 1.3: 1(15.24,0)
  round 2 hole 1.3: 2(10.16,0) 3(5.08,0) 4(0,0) 5(-5.08,0) 6(-10.16,0) 7(-15.24,0)
Top Overlay:
  lines w0.254: -18.38,-5.25 17.78,-5.25 ; -18.38,-5.25 -18.38,-5.25 ; -18.38,-5.25 -18.38,5.25 17.78,5.25 17.78,-5.25 ; 17.78,-5.25 17.78,-5.25
3D body "User Library-KF128.STEP": height 14.3, standoff -5, extent 7.02,-5.25 12.7,5.25
3D body "User Library-KF128.STEP": height 14.3, standoff -5, extent 12.1,-5.25 17.78,5.25
3D body "User Library-KF128.STEP": height 14.3, standoff -5, extent 1.94,-5.25 7.62,5.25
3D body "User Library-KF128.STEP": height 14.3, standoff -5, extent -3.14,-5.25 2.54,5.25
3D body "User Library-KF128.STEP": height 14.3, standoff -5, extent -8.22,-5.25 -2.54,5.25
3D body "User Library-KF128.STEP": height 14.3, standoff -5, extent -13.3,-5.25 -7.62,5.25
3D body "User Library-KF128.STEP": height 14.3, standoff -5, extent -18.38,-5.25 -12.7,5.25

## HEADER_KF128_8_5.08MM [mm]
pads (8):
  rect 2x2 hole 1.3: 1(17.78,0)
  round 2 hole 1.3: 2(12.7,0) 3(7.62,0) 4(2.54,0) 5(-2.54,0) 6(-7.62,0) 7(-12.7,0) 8(-17.78,0)
Top Overlay:
  lines w0.254: -20.92,5.25 20.32,5.25 ; -20.92,5.25 -20.92,-5.25 20.32,-5.25 20.32,5.25 ; -20.92,5.25 -20.92,5.25 ; 20.32,5.25 20.32,5.25
3D body "User Library-KF128.STEP": height 14.3, standoff -5, extent -20.92,-5.25 -15.24,5.25
3D body "User Library-KF128.STEP": height 14.3, standoff -5, extent 9.56,-5.25 15.24,5.25
3D body "User Library-KF128.STEP": height 14.3, standoff -5, extent 14.64,-5.25 20.32,5.25
3D body "User Library-KF128.STEP": height 14.3, standoff -5, extent 4.48,-5.25 10.16,5.25
3D body "User Library-KF128.STEP": height 14.3, standoff -5, extent -0.6,-5.25 5.08,5.25
3D body "User Library-KF128.STEP": height 14.3, standoff -5, extent -5.68,-5.25 0,5.25
3D body "User Library-KF128.STEP": height 14.3, standoff -5, extent -10.76,-5.25 -5.08,5.25
3D body "User Library-KF128.STEP": height 14.3, standoff -5, extent -15.84,-5.25 -10.16,5.25